# Altium schematic symbol library Schlib.SchLib: 725 symbols (part 2 of 6) (continued)
## C3216X5R1V226M160AC (continued)
C Series 1206 22 uF 35 V ±20 % Tolerance X5R SMT Multilayer Ceramic Capacitor; Manufacturer: TDK; Manufacturer Part Number: C3216X5R1V226M160AC; Tolerance: 20%; Voltage Rating: 35V; Supplier: Digi-Key; Supplier Part Number: 445-8045-1-ND; RoHS: Yes; Category: Ceramic Capacitors; Stock: 1168042; Pricing: 1=0.95000, 10=0.72200, 50=0.60000, 100=0.51660, 500=0.39996, 1000=0.34441 (USD); Mounting Technology: Surface Mount; Case/Package: 1206; Case Code (Metric): 3216; Case Code (Imperial): 1206; Weight: 0.000571oz; Dielectric Material: Ceramic; Min Operating Temperature: -55°C; Max Operating Temperature: 85°C; Packaging: Tape and Reel; Termination: SMD/SMT; Series: C; Package Quantity: 2000; Voltage Rating (DC): 35V; Dielectric: X5R; Resistor Type: Ceramic; Voltage: 35V; Construction: Flat; Length: 3.2mm; Width: 0.063inch; Height: 1.6mm; Depth: 1.6mm; Thickness: 1.6mm; Radiation Hardening: No; Lead Free: Lead Free; RoHS Compliant: Yes; ComponentLink1URL: https://datasheet.ciiva.com/24216/c3216x5r1v226m160ac-265035-24216573.pdf?src-supplier=Mouser; ComponentLink1Description: https://datasheet.ciiva.com/24216/c3216x5r1v226m160ac-265035-24216573.pdf?src-supplier=Mouser; ComponentLink2URL: https://datasheet.ciiva.com/23803/1796654-23803046.pdf?src-supplier=Newark; ComponentLink2Description: https://datasheet.ciiva.com/23803/1796654-23803046.pdf?src-supplier=Newark; ComponentLink3URL: https://datasheet.ciiva.com/22725/1913358-22725591.pdf?src-supplier=Element14; ComponentLink3Description: https://datasheet.ciiva.com/22725/1913358-22725591.pdf?src-supplier=Element14; ComponentLink4URL: https://datasheet.ciiva.com/22725/1913358-22725592.pdf?src-supplier=Element14; ComponentLink4Description: https://datasheet.ciiva.com/22725/1913358-22725592.pdf?src-supplier=Element14; ComponentLink5URL: https://datasheet.ciiva.com/6259/tdkmlcccaprange-6259231.pdf?src-supplier=Digi-Key; ComponentLink5Description: https://datasheet.ciiva.com/6259/tdkmlcccaprange-6259231.pdf?src-supplier=Digi-Key
footprint C 1206
pins: 1 B, 2 A

## C5750X7S2A226M280KB
designator C?  value 22uF  (hidden comment: *)
Multilayer Ceramic Capacitor, 22 uF, 100 V, ± 20%, X7S, 2220 [5750 Metric]; Manufacturer: TDK; Manufacturer Part Number: C5750X7S2A226M280KB; Voltage Rating: 100V; Supplier: Rs; Supplier Part Number: 2427439P; RoHS: Yes; Category: Ceramic Capacitors; Stock: 989; Pricing: 5=4.3, 10=4.08, 20=3.63, 100=2.95 (EUR); Case/Package: 2220; Min Operating Temperature: -55°C; Max Operating Temperature: 125°C; Length: 5.7mm; Width: 5mm; Height: 3.1mm; RoHS Compliant: Yes; ComponentLink1URL: https://datasheet.octopart.com/C5750X7S2A226M280KB-TDK-datasheet-43914167.pdf?src-supplier=Future+Electronics; ComponentLink1Description: https://datasheet.octopart.com/C5750X7S2A226M280KB-TDK-datasheet-43914167.pdf?src-supplier=Future+Electronics; ComponentLink2URL: https://datasheet.octopart.com/C5750X7S2A226M280KB-TDK-datasheet-159617022.pdf?src-supplier=TME; ComponentLink2Description: https://datasheet.octopart.com/C5750X7S2A226M280KB-TDK-datasheet-159617022.pdf?src-supplier=TME
footprint C 2220
pins: 1 B, 2 A

## CC0402KPX5R6BB104
designator C?  value 0.1uF  (hidden comment: *)
Cap Ceramic 0.1uF 10V X5R 10% SMD 0402 85C Paper T/R; Manufacturer: Yageo; Manufacturer Part Number: CC0402KPX5R6BB104; Supplier: Digi-Key; Supplier Part Number: 13-CC0402KPX5R6BB104CT-ND; RoHS: Yes; Category: Ceramic Capacitors; Stock: 882780; Pricing: 1=0.10000, 10=0.02600, 50=0.01440, 100=0.01180, 500=0.00842, 1000=0.00661, 2500=0.00601, 5000=0.00553 (USD); Case/Package: 0402; Case Code (Imperial): 0402; Case Code (Metric): 1005; Weight: 2.3E-05oz; Min Operating Temperature: -55°C; Max Operating Temperature: 85°C; Voltage Rating (DC): 10V; Tolerance: 10%; Packaging: Tape and Reel; Dielectric: X5R; Termination: SMD/SMT; Resistor Type: Ceramic; Length: 1mm; Depth: 0.5mm; Lead Free: Lead Free; Halogen Free: Halogen Free; ComponentLink1URL: http://www.mouser.com/ds/2/447/UPY-GPHC_X5R_4V-to-50V_25-1131599.pdf?src-supplier=Mouser; ComponentLink1Description: http://www.mouser.com/ds/2/447/UPY-GPHC_X5R_4V-to-50V_25-1131599.pdf?src-supplier=Mouser
footprint C 0402 (1005 Metric) (Chip Capacitor, Body 1.0x0.5mm, IPC High Density)
pins: 1 B, 2 A

## CC0402KRX5R6BB224
designator C?  value 0.22uF  (hidden comment: *)
0402 0.22 uF 10 V ±10 % Tolerance X5R SMT Multilayer Ceramic Capacitor; Manufacturer: Yageo; Manufacturer Part Number: CC0402KRX5R6BB224; Tolerance: 10%; Voltage Rating: 10V; Supplier: Future Electronics; Supplier Part Number: 2999696; RoHS: Yes; Category: Ceramic Capacitors; Stock: 1710000; Pricing: 10000=0.00450, 40000=0.00420, 100000=0.00350, 150000=0.00400, 250000=0.00330, 400000=0.00390, 1000000=0.00360 (USD); Mounting Technology: Surface Mount; Case/Package: 0402; Case Code (Metric): 1005; Case Code (Imperial): 0402; Weight: 2.3E-05oz; Dielectric Material: Ceramic; Min Operating Temperature: -55°C; Max Operating Temperature: 85°C; Dielectric: X5R; Series: CC; Package Quantity: 10000; Packaging: Tape and Reel; Voltage Rating (DC): 10V; Termination: SMD/SMT; Resistor Type: Ceramic; Length: 1mm; Width: 0.5mm; Height: 0.5mm; Depth: 0.5mm; Thickness: 0.022inch; Radiation Hardening: No; RoHS Compliant: Yes; Lead Free: Lead Free; Halogen Free: Halogen Free; ComponentLink1URL: https://datasheet.ciiva.com/28450/1359354-28450298.pdf?src-supplier=Element14; ComponentLink1Description: https://datasheet.ciiva.com/28450/1359354-28450298.pdf?src-supplier=Element14; ComponentLink2URL: https://datasheet.ciiva.com/176/mlccorderingcode-176912.pdf?src-supplier=Digi-Key; ComponentLink2Description: https://datasheet.ciiva.com/176/mlccorderingcode-176912.pdf?src-supplier=Digi-Key; ComponentLink3URL: https://datasheet.ciiva.com/176/mlccorderingcode-176911.pdf?src-supplier=Digi-Key; ComponentLink3Description: https://datasheet.ciiva.com/176/mlccorderingcode-176911.pdf?src-supplier=Digi-Key; ComponentLink4URL: https://datasheet.ciiva.com/176/mlccorderingcode-176913.pdf?src-supplier=Digi-Key; ComponentLink4Description: https://datasheet.ciiva.com/176/mlccorderingcode-176913.pdf?src-supplier=Digi-Key; ComponentLink5URL: https://datasheet.ciiva.com/8033/1525783-8033653.pdf?src-supplier=Element14; ComponentLink5Description: https://datasheet.ciiva.com/8033/1525783-8033653.pdf?src-supplier=Element14
footprint C 0402 (1005 Metric) (Chip Capacitor, Body 1.0x0.5mm, IPC High Density)
pins: 1 B, 2 A

## CC0402KRX7R9BB202
designator C?  value 2nF  (hidden comment: *)
Multilayer Ceramic Capacitor, 2000 pF, 50 V, ± 10%, X7R, 0402 [1005 Metric]; Manufacturer: Yageo; Manufacturer Part Number: CC0402KRX7R9BB202; Voltage Rating: 50V; Supplier: Arrow Electronics; Supplier Part Number: CC0402KRX7R9BB202; RoHS: Yes; Category: Ceramic Capacitors; Stock: 170000; Pricing: 10000=0.0037, 30000=0.0036, 50000=0.0033, 100000=0.0029, 250000=0.0029 (USD); Mounting Technology: Surface Mount; Case/Package: 0402; Min Operating Temperature: -55°C; Max Operating Temperature: 125°C; Packaging: Tape and Reel; Tolerance: 10%; Voltage Rating (DC): 50V; Dielectric: X7R; Series: CC; Lead Free: Lead Free; Halogen Free: Halogen Free; RoHS Compliant: Yes; ComponentLink1URL: https://datasheet.octopart.com/CC0402KRX7R9BB202-Yageo-datasheet-166511530.pdf?src-supplier=Future+Electronics; ComponentLink1Description: https://datasheet.octopart.com/CC0402KRX7R9BB202-Yageo-datasheet-166511530.pdf?src-supplier=Future+Electronics; ComponentLink2URL: https://www.yageo.com/upload/media/product/productsearch/datasheet/mlcc/UPY-GPHC_X7R_6.3V-to-50V_18.pdf?src-supplier=Digikey; ComponentLink2Description: https://www.yageo.com/upload/media/product/productsearch/datasheet/mlcc/UPY-GPHC_X7R_6.3V-to-50V_18.pdf?src-supplier=Digikey
footprint R 0402 (1005 Metric) (Chip Capacitor, Body 1.0x0.5mm, IPC High Density)
pins: 1 B, 2 A

## CDBA240LL-HF
designator D?  (value not drawn)
Rectifier Diode Schottky 40V 2A 2-Pin SMA T/R; Manufacturer: Comchip; Manufacturer Part Number: CDBA240LL-HF; Supplier: Digikey; Supplier Part Number: 641-1698-1-ND; RoHS: Yes; Category: Rectifier Diodes; Stock: 133679; Pricing: 1=0.57, 10=0.492, 100=0.3409, 500=0.28482, 1000=0.2424, 2000=0.21589 (USD); Mounting Technology: Surface Mount; Package Quantity: 5000; Packaging: Cut Tape; Average Rectified Current: 2A; Max Reverse Voltage (DC): 40V; Series: -; RoHS Compliant: Yes; ComponentLink1URL: http://www.mouser.com/ds/2/80/CDBA240LL-HF%20RevC514247-365530.pdf?src-supplier=Mouser; ComponentLink1Description: http://www.mouser.com/ds/2/80/CDBA240LL-HF%20RevC514247-365530.pdf?src-supplier=Mouser; ComponentLink2URL: http://www.comchiptech.com/admin/files/product/CDBA240LL-HF RevC514247.pdf?src-supplier=Digikey; ComponentLink2Description: http://www.comchiptech.com/admin/files/product/CDBA240LL-HF RevC514247.pdf?src-supplier=Digikey; ComponentLink3URL: http://www.comchiptech.com/cms/UserFiles/CDBA240LL-HF%20RevC514247.pdf?src-supplier=Digikey; ComponentLink3Description: http://www.comchiptech.com/cms/UserFiles/CDBA240LL-HF%20RevC514247.pdf?src-supplier=Digikey
footprint DO-214AC, SMA
pins: 1 C, 2 A

## CDSQR4148
designator D?  (value not drawn)
Rectifier Diode Small Signal Switching 100V 0.15A 4ns 2-Pin Case 0402(1006Metric) T/R; Manufacturer: Comchip; Manufacturer Part Number: CDSQR4148; Average Rectified Current: 150mA; Max Reverse Voltage (DC): 75V; Max Surge Current: 4A; Max Power Dissipation: 125mW; Max Reverse Leakage Current: 2.5uA; Supplier: Digi-Key; Supplier Part Number: 641-1287-1-ND; RoHS: Yes; Category: Rectifier Diodes; Stock: 590702; Pricing: 1=0.4, 10=0.294, 100=0.1667, 500=0.1104, 1000=0.08464, 2000=0.0736 (USD); Mounting Technology: Surface Mount; Case/Package: 0402; Case Code (Metric): 1005; Case Code (Imperial): 0402; Packaging: Tape and Reel; Reverse Recovery Time: 4ns; Series: -; Package Quantity: 5000; Recovery Time: 4ns; RoHS Compliant: Yes; ComponentLink1URL: https://datasheet.ciiva.com/912/cdsqr4148-revb370424-912608.pdf?src-supplier=Digi-Key; ComponentLink1Description: https://datasheet.ciiva.com/912/cdsqr4148-revb370424-912608.pdf?src-supplier=Digi-Key; ComponentLink2URL: https://datasheet.ciiva.com/912/cdsqr4148-revb370424-912609.pdf?src-supplier=Digi-Key; ComponentLink2Description: https://datasheet.ciiva.com/912/cdsqr4148-revb370424-912609.pdf?src-supplier=Digi-Key
footprint CDSQR4148
pins: 1 C, 2 A

## CGA1A2C0G1E1R5C030BA
designator C?, comment 1.5 pF
1.5 pF ±0.25pF 25V Ceramic Capacitor C0G, NP0 0201 (0603 Metric); Manufacturer Part Number: CGA1A2C0G1E1R5C030BA
footprint CAPC0603X33N
pins: 1, 2

## CGA1A2X7R0J103M030BA
designator C?  value 10nF  (hidden comment: *)
Multilayer Ceramic Capacitor, 0.01 uF, 6.3 V, ± 20%, X7R, 0201 [0603 Metric]; Manufacturer: TDK; Manufacturer Part Number: CGA1A2X7R0J103M030BA; Material: 4241ConductorMaterial; Voltage Rating: 6.3V; Supplier: Avnet; Supplier Part Number: CGA1A2X7R0J103M030; RoHS: Yes; Category: Ceramic Capacitors; Stock: 15000; Pricing: 15000=0.00334 (USD); Mounting Technology: Surface Mount; Case/Package: 0201; Case Code (Metric): 0603; Case Code (Imperial): 0201; Weight: 6E-06oz; Min Operating Temperature: -55°C; Max Operating Temperature: 125°C; Package Quantity: 15000; Packaging: Tape and Reel; Tolerance: 20%; Dielectric: X7R; Termination: SMD/SMT; Voltage Rating (DC): 6.3V; Series: CGA; Length: 0.6mm; Width: 0.3mm; Height: 0.3mm; Ratings: AEC-Q200; RoHS Compliant: Yes; ComponentLink1URL: http://www.mouser.com/ds/2/400/lcc_automotive_general_en-843974.pdf?src-supplier=Mouser; ComponentLink1Description: http://www.mouser.com/ds/2/400/lcc_automotive_general_en-843974.pdf?src-supplier=Mouser; ComponentLink2URL: http://product.tdk.com/capacitor/mlcc/en/documents/mlcc_automotive_general_en.pdf?src-supplier=Avnet; ComponentLink2Description: http://product.tdk.com/capacitor/mlcc/en/documents/mlcc_automotive_general_en.pdf?src-supplier=Avnet; ComponentLink3URL: https://product.tdk.com/info/en/documents/chara_sheet/CGA1A2X7R0J103M030BA.pdf?src-supplier=Digikey; ComponentLink3Description: https://product.tdk.com/info/en/documents/chara_sheet/CGA1A2X7R0J103M030BA.pdf?src-supplier=Digikey; ComponentLink4URL: https://product.tdk.com/info/en/catalog/datasheets/mlcc_automotive_general_en.pdf?src-supplier=Digikey; ComponentLink4Description: https://product.tdk.com/info/en/catalog/datasheets/mlcc_automotive_general_en.pdf?src-supplier=Digikey
footprint C 0201 (0603 Metric)
pins: 1 B, 2 A

## CGA2B2X5R1E103M050BA
designator C?  value 10nF  (hidden comment: *)
Cap Ceramic 0.01uF 25V X5R 20% SMD 0402 85°C Punched Paper T/R; Manufacturer: TDK; Manufacturer Part Number: CGA2B2X5R1E103M050BA; Supplier: Digi-Key; Supplier Part Number: 445-12174-1-ND; RoHS: Yes; Category: Ceramic Capacitors; Stock: 528323; Pricing: 1=0.10000, 10=0.03400, 50=0.01880, 100=0.01530, 500=0.01096, 1000=0.00861, 2500=0.00783, 5000=0.00720 (USD); Mounting Technology: Surface Mount; Case/Package: 0402; Case Code (Metric): 1005; Case Code (Imperial): 0402; Weight: 2.3E-05oz; Min Operating Temperature: -55°C; Max Operating Temperature: 85°C; Package Quantity: 10000; Packaging: Tape and Reel; Tolerance: 20%; Voltage Rating: 25V; Dielectric: X5R; Voltage Rating (DC): 25V; Series: CGA; Length: 0.039inch; Width: 0.5mm; Height: 0.5mm; Thickness: 0.022inch; Ratings: AEC-Q200; RoHS Compliant: Yes; ComponentLink1URL: http://www.mouser.com/ds/2/400/lcc_automotive_general_en-843974.pdf?src-supplier=Mouser; ComponentLink1Description: http://www.mouser.com/ds/2/400/lcc_automotive_general_en-843974.pdf?src-supplier=Mouser; ComponentLink2URL: https://product.tdk.com/info/en/catalog/datasheets/mlcc_automotive_general_en.pdf?src-supplier=Digi-Key; ComponentLink2Description: https://product.tdk.com/info/en/catalog/datasheets/mlcc_automotive_general_en.pdf?src-supplier=Digi-Key; ComponentLink3URL: http://product.tdk.com/en/catalog/datasheets/mlcc_automotive_general_en.pdf?src-supplier=Avnet; ComponentLink3Description: http://product.tdk.com/en/catalog/datasheets/mlcc_automotive_general_en.pdf?src-supplier=Avnet
footprint C 0402 (1005 Metric) (Chip Capacitor, Body 1.0x0.5mm, IPC High Density)
pins: 1 B, 2 A

## CGA2B2X7R1H102K050BA
designator C?  value 1nF  (hidden comment: *)
Cap Ceramic 0.001uF 50V X7R 10% SMD 0402 125C Punched Paper T/R; Manufacturer: TDK; Manufacturer Part Number: CGA2B2X7R1H102K050BA; Supplier: Digi-Key; Supplier Part Number: 445-5605-1-ND; RoHS: Yes; Category: Ceramic Capacitors; Stock: 594410; Pricing: 1=0.10000, 10=0.05000, 50=0.02720, 100=0.02230, 500=0.01590, 1000=0.01250, 2500=0.01136, 5000=0.01045 (USD); Mounting Technology: Surface Mount; Case/Package: 0402; Case Code (Metric): 1005; Case Code (Imperial): 0402; Weight: 2.3E-05oz; Min Operating Temperature: -55°C; Max Operating Temperature: 125°C; Tolerance: 10%; Dielectric: X7R; Termination: SMD/SMT; Voltage Rating: 50V; Packaging: Tape and Reel; Voltage Rating (DC): 50V; Series: CGA; Package Quantity: 1; Resistor Type: Ceramic; Construction: Flat; Length: 1mm; Width: 0.02inch; Height: 0.5mm; Depth: 0.5mm; Thickness: 0.022inch; Ratings: AEC-Q200; Radiation Hardening: No; Lead Free: Lead Free; RoHS Compliant: Yes; Reach SVHC Compliant: Yes; ComponentLink1URL: https://datasheet.ciiva.com/24216/cga2b2x7r1h102k050ba-265787-24216789.pdf?src-supplier=Mouser; ComponentLink1Description: https://datasheet.ciiva.com/24216/cga2b2x7r1h102k050ba-265787-24216789.pdf?src-supplier=Mouser; ComponentLink2URL: https://datasheet.ciiva.com/7975/1807242-7975272.pdf?src-supplier=Element14; ComponentLink2Description: https://datasheet.ciiva.com/7975/1807242-7975272.pdf?src-supplier=Element14; ComponentLink3URL: https://datasheet.ciiva.com/22725/1735392-22725624.pdf?src-supplier=Element14; ComponentLink3Description: https://datasheet.ciiva.com/22725/1735392-22725624.pdf?src-supplier=Element14; ComponentLink4URL: https://datasheet.ciiva.com/23803/1936565-23803068.pdf?src-supplier=Newark; ComponentLink4Description: https://datasheet.ciiva.com/23803/1936565-23803068.pdf?src-supplier=Newark; ComponentLink5URL: https://datasheet.ciiva.com/28563/1735392-28563932.pdf?src-supplier=Element14; ComponentLink5Description: https://datasheet.ciiva.com/28563/1735392-28563932.pdf?src-supplier=Element14
footprint C 0402 (1005 Metric) (Chip Capacitor, Body 1.0x0.5mm, IPC High Density)
pins: 1 B, 2 A

## CGA4J1X7R2A225K125AC
designator C?  value 2.2uF  (hidden comment: *)
Mlcc, 0805, X7R, 100V, 2.2 F, 1.25MM; Manufacturer: TDK; Manufacturer Part Number: CGA4J1X7R2A225K125AC; Supplier: Digikey; Supplier Part Number: 445-CGA4J1X7R2A225K125ACCT-ND; RoHS: No; Stock: 19948; Pricing: 1=0.72, 10=0.481, 50=0.3832, 100=0.3164, 500=0.2472, 1000=0.21012 (USD); Case/Package: 0805
footprint C 0805
pins: 1 B, 2 A

## CH0603-50RJNTA
designator R?  value 50Ω
SMD Chip Resistor, 50 Ohm, ± 5%, 125 mW, 0603 [1608 Metric], Thin Film, High Frequency; Manufacturer: Vishay; Manufacturer Part Number: CH0603-50RJNTA; Manufacturer Package Identifier: CH0603-N; Power Dissipation: 125mW; Temperature Coefficient: 100ppm/°C; Voltage Rating: 50V; Supplier: Mouser; Supplier Part Number: 71-CH0603-50RJNTA; RoHS: Compliant; Category: Chip SMD Resistors; Stock: 3634; Pricing: 1=3.84, 10=2.96, 50=2.85, 100=2.79, 1000=2.35, 10000=2.34 (USD); Case/Package: 0603; Composition: Thin Film; Height: 500µm; Lifecycle Status: Production; Max Operating Temperature: 155°C; Min Operating Temperature: -55°C; Mounting Technology: Surface Mount; Number of Terminals: 2; Power Rating: 125mW; REACH SVHC: Yes; Schedule B: 8533210045; Tolerance: 5%; Width: 750µm; Working Voltage: 50V; ComponentLink1URL: https://datasheet.octopart.com:443/CH0603-50RJNTA-Vishay-datasheet-170667676.pdf?src-supplier=IHS; ComponentLink1Description: https://datasheet.octopart.com:443/CH0603-50RJNTA-Vishay-datasheet-170667676.pdf?src-supplier=IHS; ComponentLink2URL: https://datasheet.octopart.com:443/CH0603-50RJNTA-Vishay-datasheet-101750232.pdf?src-supplier=Newark; ComponentLink2Description: https://datasheet.octopart.com:443/CH0603-50RJNTA-Vishay-datasheet-101750232.pdf?src-supplier=Newark; ComponentLink3URL: https://datasheet.octopart.com:443/CH0603-50RJNTA-Vishay-datasheet-157901019.pdf?src-supplier=Future+Electronics; ComponentLink3Description: https://datasheet.octopart.com:443/CH0603-50RJNTA-Vishay-datasheet-157901019.pdf?src-supplier=Future+Electronics; ComponentLink4URL: http://sigma.octopart.com:80/rohs_statement/Vishay-company-15.pdf?src-supplier=Compliance+Statements; ComponentLink4Description: http://sigma.octopart.com:80/rohs_statement/Vishay-company-15.pdf?src-supplier=Compliance+Statements
footprint R 0603 (1608 Metric)
pins: 1 B, 2 A

## CM7V-T1A-32.768KHZ-7PF-20PPM-TB-QA
designator Y?  (value not drawn)
Crystal 32.7680KHZ 7PF SMD; Manufacturer: Micro Crystal; Manufacturer Part Number: CM7V-T1A-32.768KHZ-7PF-20PPM-TB-QA; Supplier: Digikey; Supplier Part Number: 2195-CM7V-T1A-32.768KHZ-7PF-20PPM-TB-QACT-ND; RoHS: No; Stock: 12973; Pricing: 1=0.74, 10=0.657, 50=0.6146, 100=0.5431, 500=0.5145 (USD)
footprint CM7V-T1A-32.768KHZ-7PF-20PPM-TB-QA
pins: 1, 2

## CMT-1075-SMT-TR
designator Piezo?  (value not drawn)
10 mm, 25 V, 75 dB, Surface Mount (SMT), Piezo Audio Transducer Buzzer; Manufacturer: Same Sky; Manufacturer Part Number: CMT-1075-SMT-TR; Shape: Round; Voltage Rating: 25V; Supplier: DigiKey; Supplier Part Number: 102-2194-1-ND; RoHS: Compliant; Category: Buzzers; Stock: 3506; Pricing: 1=3.23, 10=2.538, 25=2.3112, 50=2.1556, 100=2.0119, 250=1.97368 (USD); Height: 3.1mm; Length: 10mm; Lifecycle Status: Production; Mounting Technology: Surface Mount; Schedule B: 8531800040, 8531800040|8531800040, 8531800040|8531800040|8531800040, 8531800040|8531800040|8531800040|8531800040; Width: 10mm; ComponentLink1URL: https://datasheet.octopart.com:443/CMT-1075-SMT-TR-Same-Sky-datasheet-188822704.pdf?src-supplier=Same+Sky; ComponentLink1Description: https://datasheet.octopart.com:443/CMT-1075-SMT-TR-Same-Sky-datasheet-188822704.pdf?src-supplier=Same+Sky; ComponentLink2URL: https://datasheet.octopart.com:443/CMT-1075-SMT-TR-Same-Sky-datasheet-181915129.pdf?src-supplier=Same+Sky; ComponentLink2Description: https://datasheet.octopart.com:443/CMT-1075-SMT-TR-Same-Sky-datasheet-181915129.pdf?src-supplier=Same+Sky; ComponentLink3URL: https://datasheet.octopart.com:443/CMT-1075-SMT-TR-CUI-Devices-datasheet-175924034.pdf?src-supplier=Same+Sky; ComponentLink3Description: https://datasheet.octopart.com:443/CMT-1075-SMT-TR-CUI-Devices-datasheet-175924034.pdf?src-supplier=Same+Sky; ComponentLink4URL: https://datasheet.octopart.com:443/CMT-1075-SMT-TR-CUI-Devices-datasheet-137938169.pdf?src-supplier=Same+Sky; ComponentLink4Description: https://datasheet.octopart.com:443/CMT-1075-SMT-TR-CUI-Devices-datasheet-137938169.pdf?src-supplier=Same+Sky; ComponentLink5URL: https://datasheet.octopart.com:443/CMT-1075-SMT-TR-Same-Sky-datasheet-190141860.pdf?src-supplier=element14+APAC; ComponentLink5Description: https://datasheet.octopart.com:443/CMT-1075-SMT-TR-Same-Sky-datasheet-190141860.pdf?src-supplier=element14+APAC; ComponentLink6URL: https://datasheet.octopart.com:443/CMT-1075-SMT-TR-Same-Sky-datasheet-182879910.pdf?src-supplier=Electro+Sonic; ComponentLink6Description: https://datasheet.octopart.com:443/CMT-1075-SMT-TR-Same-Sky-datasheet-182879910.pdf?src-supplier=Electro+Sonic; ComponentLink7URL: https://datasheet.octopart.com:443/CMT-1075-SMT-TR-CUI-Devices-datasheet-175925404.pdf?src-supplier=Master+Electronics; ComponentLink7Description: https://datasheet.octopart.com:443/CMT-1075-SMT-TR-CUI-Devices-datasheet-175925404.pdf?src-supplier=Master+Electronics; ComponentLink8URL: https://datasheet.octopart.com:443/CMT-1075-SMT-TR-CUI-Devices-datasheet-140999890.pdf?src-supplier=Master+Electronics; ComponentLink8Description: https://datasheet.octopart.com:443/CMT-1075-SMT-TR-CUI-Devices-datasheet-140999890.pdf?src-supplier=Master+Electronics; ComponentLink9URL: https://datasheet.octopart.com:443/CMT-1075-SMT-TR-CUI-Devices-datasheet-127114303.pdf?src-supplier=Master+Electronics; ComponentLink9Description: https://datasheet.octopart.com:443/CMT-1075-SMT-TR-CUI-Devices-datasheet-127114303.pdf?src-supplier=Master+Electronics; ComponentLink10URL: https://datasheet.octopart.com:443/CMT-1075-SMT-TR-Same-Sky-datasheet-189104596.pdf?src-supplier=Master+Electronics; ComponentLink10Description: https://datasheet.octopart.com:443/CMT-1075-SMT-TR-Same-Sky-datasheet-189104596.pdf?src-supplier=Master+Electronics; ComponentLink11URL: https://datasheet.octopart.com:443/CMT-1075-SMT-TR-Same-Sky-datasheet-188930389.pdf?src-supplier=TME; ComponentLink11Description: https://datasheet.octopart.com:443/CMT-1075-SMT-TR-Same-Sky-datasheet-188930389.pdf?src-supplier=TME; ComponentLink12URL: https://datasheet.octopart.com:443/CMT-1075-SMT-TR-Same-Sky-datasheet-182049137.pdf?src-supplier=Future+Electronics; ComponentLink12Description: https://datasheet.octopart.com:443/CMT-1075-SMT-TR-Same-Sky-datasheet-182049137.pdf?src-supplier=Future+Electronics; ComponentLink13URL: https://datasheet.octopart.com:443/CMT-1075-SMT-TR-Same-Sky-datasheet-182049138.pdf?src-supplier=Future+Electronics; ComponentLink13Description: https://datasheet.octopart.com:443/CMT-1075-SMT-TR-Same-Sky-datasheet-182049138.pdf?src-supplier=Future+Electronics; ComponentLink14URL: https://datasheet.octopart.com:443/CMT-1075-SMT-TR-CUI-Devices-datasheet-175923639.pdf?src-supplier=Future+Electronics; ComponentLink14Description: https://datasheet.octopart.com:443/CMT-1075-SMT-TR-CUI-Devices-datasheet-175923639.pdf?src-supplier=Future+Electronics; ComponentLink15URL: https://datasheet.octopart.com:443/CMT-1075-SMT-TR-CUI-Devices-datasheet-137788096.pdf?src-supplier=Future+Electronics; ComponentLink15Description: https://datasheet.octopart.com:443/CMT-1075-SMT-TR-CUI-Devices-datasheet-137788096.pdf?src-supplier=Future+Electronics; ComponentLink16URL: https://datasheet.octopart.com:443/CMT-1075-SMT-TR-CUI-Devices-datasheet-175926990.pdf?src-supplier=CUI+Devices+SCT; ComponentLink16Description: https://datasheet.octopart.com:443/CMT-1075-SMT-TR-CUI-Devices-datasheet-175926990.pdf?src-supplier=CUI+Devices+SCT; ComponentLink17URL: https://datasheet.octopart.com:443/CMT-1075-SMT-TR-CUI-Devices-datasheet-142348061.pdf?src-supplier=CUI+Devices+SCT; ComponentLink17Description: https://datasheet.octopart.com:443/CMT-1075-SMT-TR-CUI-Devices-datasheet-142348061.pdf?src-supplier=CUI+Devices+SCT; ComponentLink18URL: https://octopart.com:443/opatz8j6/c1?t=R7gemLQVhh_OwX5PMm3Z4XFdJadwGTZGj2t0OqWA2kUa0YEMQf_8yip0XTElqNQYMXHAn-7WuvozwuIznCWtJVsOd476IQTzwKCjyV0KrkAKJ5-U2jhlzzcIAMQbrXr2EMK8TDD9zvaFe9Adsnj9bJ7iWlewwpALgLMg-GUO09Fq3zBXXpNAvTfufywhmP50xCTYmY9RKM2BWnx7xK1vRfByjiSuuYDNubhR4zojtOvX7_6n5RDBBX1n4WSbytiu2upuIcXeiKaOGABgEcQ-yuetiqB2lk-v576g2aNxPeiBXpfmxVSXusEIranLsAjnR7sbtg804BMWJdQxB3rWi_0eRvk4rMQspfsP0N1Zqwjo&src-supplier=Compliance+Statements; ComponentLink18Description: https://octopart.com:443/opatz8j6/c1?t=R7gemLQVhh_OwX5PMm3Z4XFdJadwGTZGj2t0OqWA2kUa0YEMQf_8yip0XTElqNQYMXHAn-7WuvozwuIznCWtJVsOd476IQTzwKCjyV0KrkAKJ5-U2jhlzzcIAMQbrXr2EMK8TDD9zvaFe9Adsnj9bJ7iWlewwpALgLMg-GUO09Fq3zBXXpNAvTfufywhmP50xCTYmY9RKM2BWnx7xK1vRfByjiSuuYDNubhR4zojtOvX7_6n5RDBBX1n4WSbytiu2upuIcXeiKaOGABgEcQ-yuetiqB2lk-v576g2aNxPeiBXpfmxVSXusEIranLsAjnR7sbtg804BMWJdQxB3rWi_0eRvk4rMQspfsP0N1Zqwjo&src-supplier=Compliance+Statements; ComponentLink19URL: https://octopart.com:443/opatz8j6/c1?t=lLRWQRocHRj4kXm0YLbjrZ5Bi8Bys-KoT8HSmxlHD1mxA7lEApwwcN8USufJdETK-sB5hOcmAC1cp3bG3gBFK5JQAG7TTiWo5qzS8sYHTTlTd_PGfxMG9hAuS88utC6aclgYXJbL7xqziMZ2RTNMZtea2bmahyDJ_cFYROecsi73CmgstCY7fUPQ2STqIEszIfBTDYpRxzdaVdIqy71RVfKp6pCqSlybjgo0fLsf1UFZTW9_-6e_VakxEyujLhcSnluTvVb_TmwoqG08yJikrXhU-o84Nn-_BEW6T2oT3hV-RDogAk7fN9zz07vCwHUSNPwM8Wl5qNf893VXVpuaFfrE5roWh6qa65i8oL8&src-supplier=Compliance+Statements; ComponentLink19Description: https://octopart.com:443/opatz8j6/c1?t=lLRWQRocHRj4kXm0YLbjrZ5Bi8Bys-KoT8HSmxlHD1mxA7lEApwwcN8USufJdETK-sB5hOcmAC1cp3bG3gBFK5JQAG7TTiWo5qzS8sYHTTlTd_PGfxMG9hAuS88utC6aclgYXJbL7xqziMZ2RTNMZtea2bmahyDJ_cFYROecsi73CmgstCY7fUPQ2STqIEszIfBTDYpRxzdaVdIqy71RVfKp6pCqSlybjgo0fLsf1UFZTW9_-6e_VakxEyujLhcSnluTvVb_TmwoqG08yJikrXhU-o84Nn-_BEW6T2oT3hV-RDogAk7fN9zz07vCwHUSNPwM8Wl5qNf893VXVpuaFfrE5roWh6qa65i8oL8&src-supplier=Compliance+Statements; ComponentLink20URL: https://octopart.com:443/opatz8j6/c1?t=eNJJACcM37EZCFIl17hwyVaYzmk7bE6Htl-TDAzIKH_a652AHVuoFw7FEGHjuJ-ZqULk049zbiFQm-fM38rj-Qo1PoxrKGHnEuQVG6BJEtO6qU94Uu1tiKsva3r28twgyVZdPKofW6H8-muJvG5AEx8WuVDFJSQ_LgrKna4Y1yukGOL_FAwBt_zk868aYL8wxvtyamgbBLmfqFdkXo8Zd9cYl4fABXbFZ9pj9uQFSN7e8V6ieFmqRbUpxWqIstDYn1HiawImBssyLIETMz6nNzD-Q6B51tnnpSmDjEOhjbjS7WDbXsCFZWCrSLKOpBTYJehVOODAqQXNQujx6SGahMHGC_bAvzzPZwlrqTHFtnBA&src-supplier=Compliance+Statements; ComponentLink20Description: https://octopart.com:443/opatz8j6/c1?t=eNJJACcM37EZCFIl17hwyVaYzmk7bE6Htl-TDAzIKH_a652AHVuoFw7FEGHjuJ-ZqULk049zbiFQm-fM38rj-Qo1PoxrKGHnEuQVG6BJEtO6qU94Uu1tiKsva3r28twgyVZdPKofW6H8-muJvG5AEx8WuVDFJSQ_LgrKna4Y1yukGOL_FAwBt_zk868aYL8wxvtyamgbBLmfqFdkXo8Zd9cYl4fABXbFZ9pj9uQFSN7e8V6ieFmqRbUpxWqIstDYn1HiawImBssyLIETMz6nNzD-Q6B51tnnpSmDjEOhjbjS7WDbXsCFZWCrSLKOpBTYJehVOODAqQXNQujx6SGahMHGC_bAvzzPZwlrqTHFtnBA&src-supplier=Compliance+Statements; ComponentLink21URL: https://octopart.com:443/opatz8j6/c1?t=inNJA7JsionMAL1D7ZIGqkj7Wg_T0-CJAC1UvkQORHXHHByi2trKQV8CVk0RU1DnODFSeMX9S46sf_9djqcuNh9gmhBNSa1hNZq8YRpvTCxyz6ILR3VUBCx3Le7NKrsC3skY2CQ4YrmP_GXuSVA44sI7T49fknEL7az8JWUmMOqyp64VU8VbPnMJTBDh0CqeCoQziuEeNLy-jsi4qV65P7hN9j2fk3yyd8dXsFIX-QkJxOdTubaEfABo4isf9U1zisLK-bmrbzV_ZkM3Uh2q--LwXVTAdLHwtzO5JO8zPX3S_aRCTumhbogjPgPYKXSq612d6cmg5BEjiHd_ccDjLUPwdrRtezeKMSy_drI&src-supplier=Compliance+Statements; ComponentLink21Description: https://octopart.com:443/opatz8j6/c1?t=inNJA7JsionMAL1D7ZIGqkj7Wg_T0-CJAC1UvkQORHXHHByi2trKQV8CVk0RU1DnODFSeMX9S46sf_9djqcuNh9gmhBNSa1hNZq8YRpvTCxyz6ILR3VUBCx3Le7NKrsC3skY2CQ4YrmP_GXuSVA44sI7T49fknEL7az8JWUmMOqyp64VU8VbPnMJTBDh0CqeCoQziuEeNLy-jsi4qV65P7hN9j2fk3yyd8dXsFIX-QkJxOdTubaEfABo4isf9U1zisLK-bmrbzV_ZkM3Uh2q--LwXVTAdLHwtzO5JO8zPX3S_aRCTumhbogjPgPYKXSq612d6cmg5BEjiHd_ccDjLUPwdrRtezeKMSy_drI&src-supplier=Compliance+Statements
footprint CMT-1075-SMT-TR
pins: 1, 2

## CMT-8504-100-SMT-TR
designator *
8.5 mm, 5 Vo-p, 100 dB, Surface Mount (SMT), Magnetic Audio Transducer Buzzer; Manufacturer: Same Sky; Manufacturer Part Number: CMT-8504-100-SMT-TR; Shape: Square; Voltage Rating: 5V; Supplier: Digikey; Supplier Part Number: 102-CMT-8504-100-SMT-CT-ND; RoHS: No; Stock: 140886; Pricing: 1=1.61, 10=1.309, 25=1.2064, 50=1.1344, 100=1.0671, 250=0.98444, 500=0.92648 (USD); Mounting Technology: Surface Mount; Length: 8.5mm; Width: 8.5mm; Height: 4mm; ComponentLink1URL: https://datasheet.octopart.com/CMT-8504-100-SMT-TR-CUI-Devices-datasheet-175923503.pdf?src-supplier=Future+Electronics; ComponentLink1Description: https://datasheet.octopart.com/CMT-8504-100-SMT-TR-CUI-Devices-datasheet-175923503.pdf?src-supplier=Future+Electronics; ComponentLink2URL: https://datasheet.octopart.com/CMT-8504-100-SMT-TR-CUI-Devices-datasheet-137140845.pdf?src-supplier=Master+Electronics; ComponentLink2Description: https://datasheet.octopart.com/CMT-8504-100-SMT-TR-CUI-Devices-datasheet-137140845.pdf?src-supplier=Master+Electronics
pins: N, P
text: +; -

## Component_1LQW15AN2N7G8ZD
designator *

## Conn 4
designator P?  (value not drawn)
footprint CONN 4
pins: 1, 2, 3, 4

## CRCW0402120RFKEDC
designator R?  value 120Ω  (hidden comment: *)
Res Thick Film 0402 120 Ohm 1% 0.063W(1/16W) ±100ppm/C Pad SMD T/R; Manufacturer: Vishay; Manufacturer Part Number: CRCW0402120RFKEDC; Power Dissipation: 63mW; Temperature Coefficient: 100ppm/°C; Voltage Rating: 50V; Supplier: Future Electronics; Supplier Part Number: 7186645; RoHS: Compliant; Category: Chip SMD Resistors; Stock: 30000; Pricing: 10000=0.0018, 40000=0.0018, 150000=0.0017, 250000=0.0017, 500000=0.0016 (USD); Case/Package: 0402; China RoHS: Non-Compliant; Composition: Thick Film; Height: 300µm; Lead Free: Lead Free; Lifecycle Status: Production; Max Operating Temperature: 155°C; Min Operating Temperature: -55°C; Mounting Technology: Surface Mount; Number of Terminals: 2; Power Rating: 63mW; REACH SVHC: Yes; Schedule B: 8533210045, 8533210045|8533210045, 8533210045|8533210045|8533210045, 8533210045|8533210045|8533210045|8533210045; Tolerance: 1%; Width: 500µm; Working Voltage: 50V; ComponentLink1URL: https://datasheet.octopart.com:443/CRCW0402120RFKEDC-Vishay-datasheet-102570912.pdf?src-supplier=Upverter; ComponentLink1Description: https://datasheet.octopart.com:443/CRCW0402120RFKEDC-Vishay-datasheet-102570912.pdf?src-supplier=Upverter; ComponentLink2URL: https://datasheet.octopart.com:443/CRCW0402120RFKEDC-Vishay-datasheet-175423585.pdf?src-supplier=IHS; ComponentLink2Description: https://datasheet.octopart.com:443/CRCW0402120RFKEDC-Vishay-datasheet-175423585.pdf?src-supplier=IHS; ComponentLink3URL: https://datasheet.octopart.com:443/CRCW0402120RFKEDC-Vishay-datasheet-62316122.pdf?src-supplier=Future+Electronics; ComponentLink3Description: https://datasheet.octopart.com:443/CRCW0402120RFKEDC-Vishay-datasheet-62316122.pdf?src-supplier=Future+Electronics; ComponentLink4URL: http://sigma.octopart.com:80/rohs_statement/Vishay-company-15.pdf?src-supplier=Compliance+Statements; ComponentLink4Description: http://sigma.octopart.com:80/rohs_statement/Vishay-company-15.pdf?src-supplier=Compliance+Statements
footprint R 0402 (1005 Metric) (Chip Capacitor, Body 1.0x0.5mm, IPC High Density)
pins: 1 B, 2 A

## CSD19533Q5A
designator Q?  (value not drawn)
100-V, N channel NexFET™ power MOSFET, single SON 5 mm x 6 mm, 9.5 mOhm 8-VSONP -55 to 150; Manufacturer: Texas Instruments; Manufacturer Part Number: CSD19533Q5A; Rds On Max: 9.4mR; Input Capacitance: 2.67nF; Rise Time: 6ns; Drain to Source Voltage (Vdss): 100V; Continuous Drain Current (ID): 100A; Max Power Dissipation: 3.2W; Threshold Voltage: 2.8V; Number of Elements: 1; Turn-Off Delay Time: 16ns; Fall Time: 5ns; Gate to Source Voltage (Vgs): 20V; Drain to Source Resistance: 8.7mR; Polarity: N-CHANNEL; Supplier: Mouser; Supplier Part Number: 595-CSD19533Q5A; RoHS: Yes; Category: MOSFETs; Stock: 8118; Pricing: 1=1.4, 10=1.15, 50=1.15, 100=0.894, 1000=0.616, 10000=0.551 (USD); Mounting Technology: Surface Mount; Case/Package: SON; Pins: 8; Contact Plating: Tin; Min Operating Temperature: -55°C; Max Operating Temperature: 150°C; Package Quantity: 2500; Packaging: Tape and Reel; Power Dissipation: 3.2W; Turn-On Delay Time: 6ns; Element Configuration: Single; Number of Channels: 1; Series: NexFET™; Drain to Source Breakdown Voltage: 100V; Reach SVHC Compliant: No; Lead Free: Contains Lead; RoHS Compliant: Yes; ComponentLink1URL: https://datasheet.ciiva.com/29752/csd19533q5a-29752194.pdf?src-supplier=Digikey; ComponentLink1Description: https://datasheet.ciiva.com/29752/csd19533q5a-29752194.pdf?src-supplier=Digikey; ComponentLink2URL: https://datasheet.ciiva.com/46430/1824682-46430379.pdf?src-supplier=Element14; ComponentLink2Description: https://datasheet.ciiva.com/46430/1824682-46430379.pdf?src-supplier=Element14; ComponentLink3URL: https://datasheet.ciiva.com/29752/csd19533q5a-29752206.pdf?src-supplier=Digikey; ComponentLink3Description: https://datasheet.ciiva.com/29752/csd19533q5a-29752206.pdf?src-supplier=Digikey; ComponentLink4URL: https://datasheet.ciiva.com/30021/csd19533q5a-30021948.pdf?src-supplier=Avnet; ComponentLink4Description: https://datasheet.ciiva.com/30021/csd19533q5a-30021948.pdf?src-supplier=Avnet
footprint 8-VSONP (5x6)
pins: 1 S, 2 S, 3 S, 4 G, 5 D, 6 D, 7 D, 8 D

## CSS2H-2512R-1L00F
designator R?  value 1mR  (hidden comment: *)
SMD Current Sense Resistor, 1 Milliohm, ± 1%, 5 W, 2512 [6432 Metric], Metal Strip; Manufacturer: Bourns; Manufacturer Part Number: CSS2H-2512R-1L00F; Temperature Coefficient: 50ppm/°C; Max Power Dissipation: 5W; Supplier: Arrow Electronics; Supplier Part Number: CSS2H-2512R-1L00F; RoHS: Yes; Category: Chip SMD Resistors; Stock: 9000; Pricing: 3000=0.347, 6000=0.3404, 9000=0.3306 (USD); Case/Package: 2512; Case Code (Metric): 6432; Case Code (Imperial): 2512; Min Operating Temperature: -55°C; Max Operating Temperature: 170°C; Packaging: Cut Tape; Number of Terminations: 2; Tolerance: 1%; Features: Moisture Resistant; Series: CSS2H-2512; Power Rating: 5W; Resistor Type: Metal Strip; Resistance Tolerance: 1%; Length: 0.25inch; Width: 0.12inch; Height: 0.02inch; RoHS Compliant: Yes; Reach SVHC Compliant: No; ComponentLink1URL: http://www.farnell.com/datasheets/2058210.pdf?src-supplier=Farnell; ComponentLink1Description: http://www.farnell.com/datasheets/2058210.pdf?src-supplier=Farnell; ComponentLink2URL: http://www.mouser.com/ds/2/54/ss2h-2512-935127.pdf?src-supplier=Mouser; ComponentLink2Description: http://www.mouser.com/ds/2/54/ss2h-2512-935127.pdf?src-supplier=Mouser; ComponentLink3URL: https://datasheet.octopart.com/CSS2H-2512R-1L00F-Bourns-datasheet-62345526.pdf?src-supplier=Newark; ComponentLink3Description: https://datasheet.octopart.com/CSS2H-2512R-1L00F-Bourns-datasheet-62345526.pdf?src-supplier=Newark; ComponentLink4URL: http://www.farnell.com/datasheets/2058210.pdf?src-supplier=Element14; ComponentLink4Description: http://www.farnell.com/datasheets/2058210.pdf?src-supplier=Element14; ComponentLink5URL: http://www.farnell.com/datasheets/2058210.pdf?src-supplier=Newark; ComponentLink5Description: http://www.farnell.com/datasheets/2058210.pdf?src-supplier=Newark; ComponentLink6URL: https://datasheet.octopart.com/CSS2H-2512R-1L00F-Bourns-datasheet-137010645.pdf?src-supplier=Electro+Sonic; ComponentLink6Description: https://datasheet.octopart.com/CSS2H-2512R-1L00F-Bourns-datasheet-137010645.pdf?src-supplier=Electro+Sonic
footprint R 2512 6W Current sens
pins: 1 B, 2 A

## CSS2H-2512R-1L00FE
designator R?  value 1mR  (hidden comment: *)
Res Metal Strip 2512 0.001 Ohm 1% 5W ±75ppm/°C Pad SMD Automotive T/R; Manufacturer: Bourns; Manufacturer Part Number: CSS2H-2512R-1L00FE; Temperature Coefficient: 50ppm/°C; Supplier: Mouser; Supplier Part Number: 652-CSS2H2512R1L00FE; RoHS: Yes; Category: Chip SMD Resistors; Stock: 1601; Pricing: 1=1.12, 10=0.835, 50=0.835, 100=0.723, 1000=0.427, 10000=0.399 (USD); Case/Package: 2512; Case Code (Imperial): 2512; Case Code (Metric): 6432; Min Operating Temperature: -55°C; Max Operating Temperature: 170°C; Features: Moisture Resistant; Packaging: Cut Tape; Tolerance: 1%; Max Power Dissipation: 5W; Number of Terminations: 2; Series: CSS2H-2512; RoHS Compliant: Yes; ComponentLink1URL: https://www.bourns.com/docs/Product-Datasheets/css2h-2512.pdf?src-supplier=Digi-Key; ComponentLink1Description: https://www.bourns.com/docs/Product-Datasheets/css2h-2512.pdf?src-supplier=Digi-Key
pins: 1 B, 2 A
